# Altium footprint library 7Robot.PcbLib: 67 footprints (part 5 of 5)
Each footprint in its own frame and in the unit in brackets; x right, y up, seen from the top. Pads: shape width x height; smd on the part's side, far side on the other; paste and mask are expansions set on the pad; w line width, h text height; cw(c..) or ccw(c..) is an arc to the next point about the centre after c.
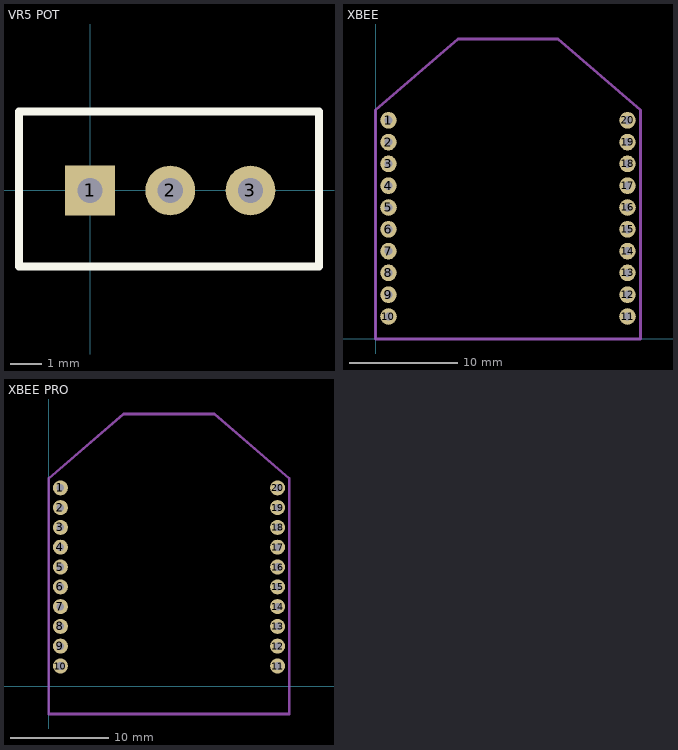
[diagram p4: the footprints below, top view; thin cyan lines are the x and y axes]

## VR5 POT [mil] "Potentiometre ajustable"
pads (3):
  rect 62x62 hole 31.5: 1(0,0)
  round 62 hole 31.5: 2(100,0) 3(200,0)
Top Overlay:
  lines w10: -88.58,-94.88 -88.58,98.43 285.43,98.43 285.43,-94.88 -88.58,-94.88
3D body: height 454.72, standoff -251.97, extent -88.19,-94.69 287.01,95.51

## XBEE [mil] "Module XBEE"
height 110
pads (20):
  round 60 hole 30: 1(47,792.5) 2(47,713.5) 3(47,634.5) 4(47,555.5) 5(47,476.5) 6(47,397.5) 7(47,318.5) 8(47,239.5) 9(47,160.5) 10(47,81.5) 11(913,81.5) 12(913,160.5) 13(913,239.5) 14(913,318.5) 15(913,397.5) 16(913,476.5) 17(913,555.5) 18(913,634.5) 19(913,713.5) 20(913,792.5)
Mechanical 1:
  lines w10: 0,0 0,830 299,1087 661,1087 960,830 960,0 0,0

## XBEE PRO [mil] "Module XBEE PRO"
height 110
pads (20):
  round 60 hole 30: 1(47,792.5) 2(47,713.5) 3(47,634.5) 4(47,555.5) 5(47,476.5) 6(47,397.5) 7(47,318.5) 8(47,239.5) 9(47,160.5) 10(47,81.5) 11(913,81.5) 12(913,160.5) 13(913,239.5) 14(913,318.5) 15(913,397.5) 16(913,476.5) 17(913,555.5) 18(913,634.5) 19(913,713.5) 20(913,792.5)
Mechanical 1:
  lines w10: 0,-110 0,830 299,1087 661,1087 960,830 960,-110 0,-110